# Altium schematic symbol library Regulator_Switching.SchLib: 1070 symbols (part 4 of 9) (continued)
## LTC1436A
designator *  value LTC1436A
ki_keywords: buck controller 36V; ki_description: High Efficiency Low Noise Synchronous Step-Down Switching Regulators, SSOP-24; ki_fp_filters: SSOP*3.9x8.7mm*P0.635mm*; Footprint: Package_SO:SSOP-24_3.9x8.7mm_P0.635mm; Supplier: https://www.analog.com/media/en/technical-documentation/data-sheets/14367afb.pdf
footprint SSOP-24_3.9x8.7mm_P0.635mm
pins: 1 COSC, 2 RUN/SS, 3 LBO (oc), 4 LBI (in), 5 ITH, 6 SFB, 7 SGND (power), 8 VPROG (in), 9 VOSENSE (in), 10 SENSE- (in), 11 SENSE+ (in), 12 AUXON (in), 13 AUXFB (in), 14 AUXDR (oc), 15 EXTVCC (power), 16 PGND (power), 17 BG (out), 18 INTVCC (power), 19 VIN (power), 20 TGS (out), 21 SW, 22 TGL (out), 23 BOOST, 24 POR (oc)

## LTC1436A-PLL
designator *  value LTC1436A-PLL
ki_keywords: buck controller 36V; ki_description: High Efficiency Low Noise Synchronous Step-Down Switching Regulators, SSOP-24; ki_fp_filters: SSOP*3.9x8.7mm*P0.635mm*; Footprint: Package_SO:SSOP-24_3.9x8.7mm_P0.635mm; Supplier: https://www.analog.com/media/en/technical-documentation/data-sheets/14367afb.pdf
footprint SSOP-24_3.9x8.7mm_P0.635mm
pins: 1 PLLLPF, 2 COSC, 3 RUN/SS, 4 ITH, 5 SFB, 6 SGND (power), 7 VPROG (in), 8 VOSENSE (in), 9 SENSE- (in), 10 SENSE+ (in), 11 AUXON (in), 12 AUXFB (in), 13 AUXDR (oc), 14 EXTVCC (power), 15 PGND (power), 16 BG (out), 17 INTVCC (power), 18 VIN (power), 19 TGS (out), 20 SW, 21 TGL (out), 22 BOOST, 23 POR (oc), 24 PLLIN (in)

## LTC1437A
designator *  value LTC1437A
ki_keywords: buck controller 36V; ki_description: High Efficiency Low Noise Synchronous Step-Down Switching Regulators, SSOP-28; ki_fp_filters: SSOP*5.3x10.2mm*P0.65mm*; Footprint: Package_SO:SSOP-28_5.3x10.2mm_P0.65mm; Supplier: https://www.analog.com/media/en/technical-documentation/data-sheets/14367afb.pdf
footprint SSOP-28_5.3x10.2mm_P0.65mm
pins: 1 PLLLPF, 2 COSC, 3 RUN/SS, 4 LBO (oc), 5 LBI (in), 6 ITH, 7 SFB, 8 SGND (power), 9 VPROG (in), 10 VOSENSE (in), 11 NC (in) hidden, 12 SENSE- (in), 13 SENSE+ (in), 14 AUXON (in), 15 AUXFB (in), 16 AUXDR (oc), 17 EXTVCC (power), 18 PGND (power), 19 BG (out), 20 DRVCC (power), 21 INTVCC (power), 22 VIN (power), 23 TGS (out), 24 SW, 25 TGL (out), 26 BOOST, 27 POR (oc), 28 PLLIN (in)

## LTC1878EMS8
designator *  value LTC1878EMS8
ki_keywords: Synchronous Step-Down Regulator; ki_description: High Efficiency Monolithic Synchronous Step-Down Regulator, MSOP-8; ki_fp_filters: MSOP*3x3mm*P0.65mm*; Footprint: Package_SO:MSOP-8_3x3mm_P0.65mm; Supplier: https://www.analog.com/media/en/technical-documentation/data-sheets/1878f.pdf
footprint MSOP-8_3x3mm_P0.65mm
pins: 1 RUN (in), 2 ITH (in), 3 VFB (in), 4 GND (power), 5 SW (out), 6 VIN (power), 7 SYNC/MODE (in), 8 PLL_LPF (io)

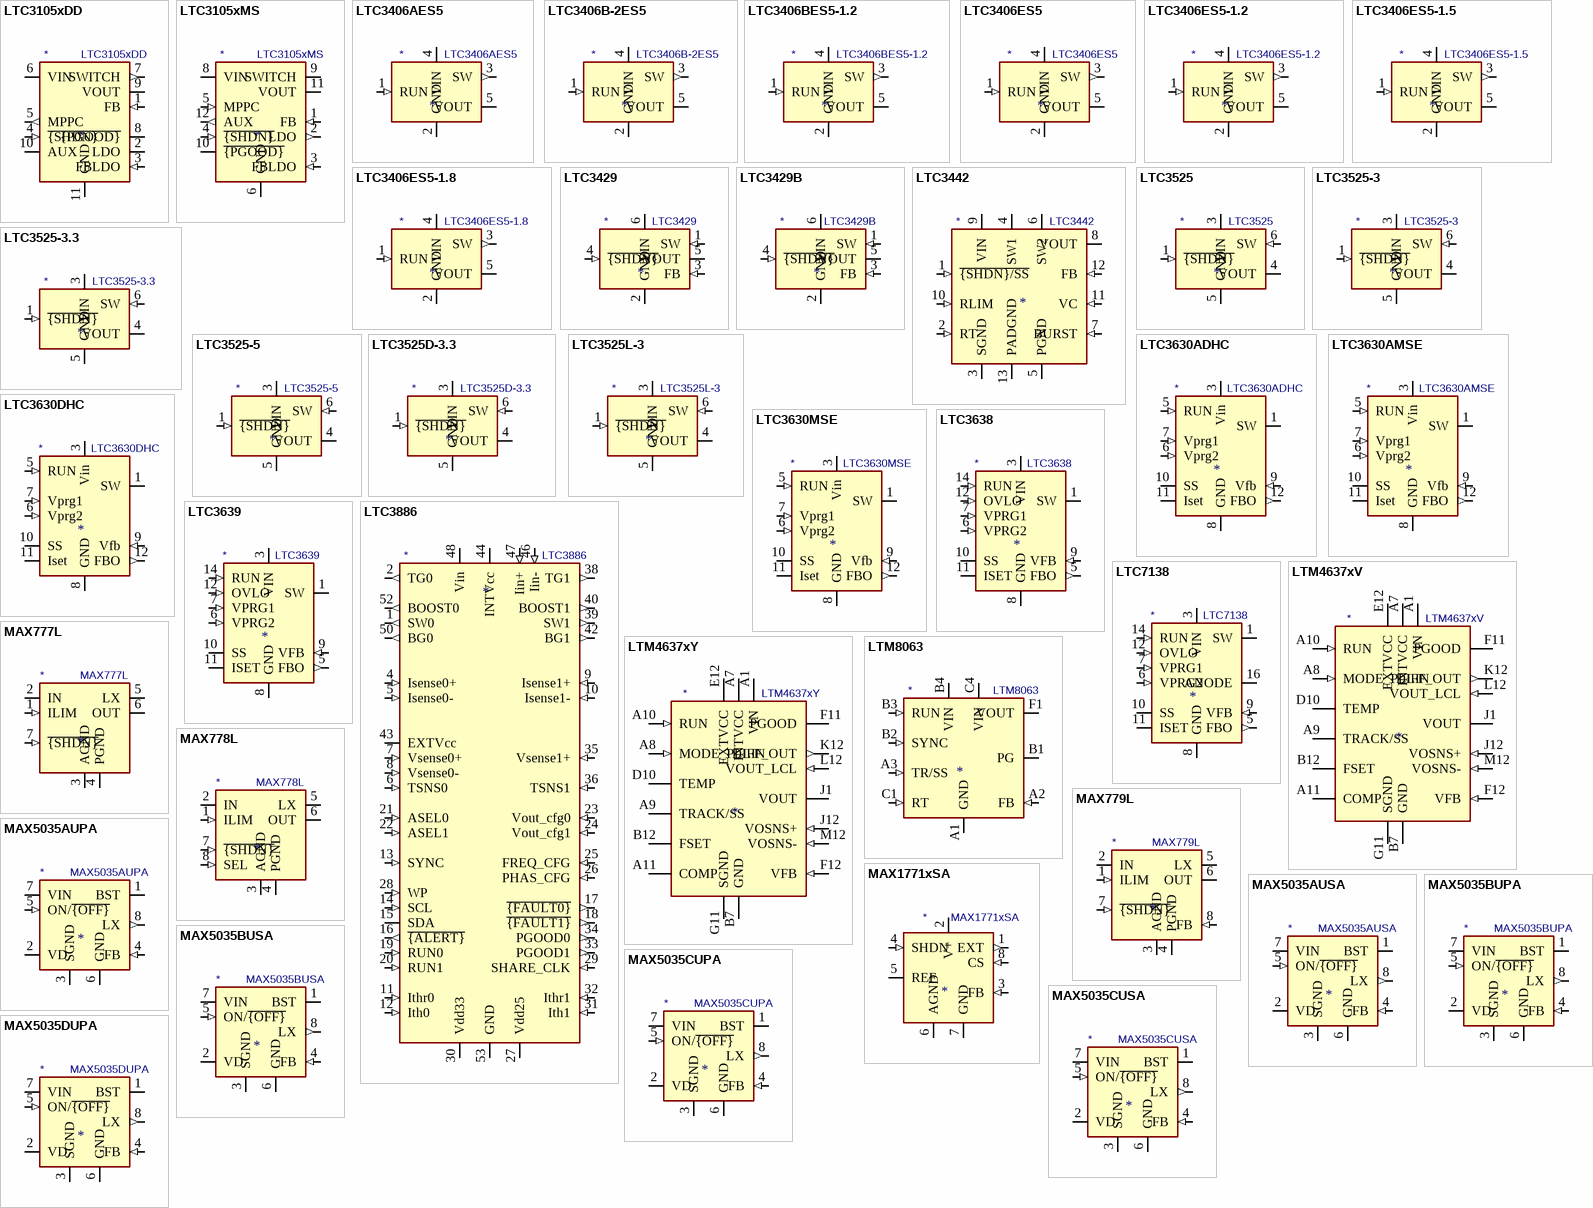
[diagram p12: symbols LTC3105xDD to MAX5035DUPA]

## LTC3105xDD
designator *  value LTC3105xDD
ki_keywords: Solar MPPT Maximum Power Point Control Converter Step-Up; ki_description: 400mA Step-Up DC/DC Converter with Maximum Power Point Control and 250mV Start-Up, DFN-10; ki_fp_filters: DFN*EP*3x3mm*0.5mm*EP*; Footprint: Package_DFN_QFN:DFN-10-1EP_3x3mm_P0.5mm_EP1.65x2.38mm; Supplier: https://www.analog.com/media/en/technical-documentation/data-sheets/3105fb.pdf
footprint DFN-10-1EP_3x3mm_P0.5mm_EP1.65x2.38mm
pins: 1 FB (in), 2 LDO (power), 3 FBLDO (in), 4 ~{{SHDN}} (in), 5 MPPC (out), 6 VIN (power), 7 SWITCH (out), 8 ~{{PGOOD}} (oc), 9 VOUT (power), 10 AUX (power), 11 GND (power)

## LTC3105xMS
designator *  value LTC3105xMS
ki_keywords: Solar MPPT Maximum Power Point Control Converter Step-Up; ki_description: 400mA Step-Up DC/DC Converter with Maximum Power Point Control and 250mV Start-Up, MSOP-12; ki_fp_filters: MSOP*3x4mm*0.65mm*; Footprint: Package_SO:MSOP-12_3x4mm_P0.65mm; Supplier: https://www.analog.com/media/en/technical-documentation/data-sheets/3105fb.pdf
footprint MSOP-12_3x4mm_P0.65mm
pins: 1 FB (in), 2 LDO (out), 3 FBLDO (in), 4 ~{{SHDN}} (in), 5 MPPC (in), 6 GND (power), 7 GND hidden, 8 VIN (power), 9 SWITCH, 10 ~{{PGOOD}} (oc), 11 VOUT (power), 12 AUX (out)

## LTC3406AES5
designator *  value LTC3406AES5
ki_keywords: Regulator step-down; ki_description: 600mA Synchronous Step-Down Regulator, 1.5MHz, Fixed 1.2V Output Voltage, Low Ripple Burst Mode, ThinSOT-23; ki_fp_filters: TSOT?23*; Footprint: Package_TO_SOT_SMD:TSOT-23-5; Supplier: https://www.analog.com/media/en/technical-documentation/data-sheets/3406afa.pdf
footprint TSOT-23-5
pins: 1 RUN (in), 2 GND (power), 3 SW (out), 4 VIN (power), 5 VOUT (power)

## LTC3406B-2ES5
designator *  value LTC3406B-2ES5
ki_keywords: Regulator step-down; ki_description: 600mA Synchronous Step-Down Regulator, 2.25MHz, Adjustable Output Voltage,ThinSOT-23; ki_fp_filters: TSOT?23*; Footprint: Package_TO_SOT_SMD:TSOT-23-5; Supplier: https://www.analog.com/media/en/technical-documentation/data-sheets/3406b2fs.pdf
footprint TSOT-23-5
pins: 1 RUN (in), 2 GND (power), 3 SW (out), 4 VIN (power), 5 VOUT (power)

## LTC3406BES5-1.2
designator *  value LTC3406BES5-1.2
ki_keywords: Regulator step-down; ki_description: 600mA Synchronous Step-Down Regulator, 1.5MHz, Fixed 1.2V Output Voltage, Burst Mode Disabled, ThinSOT-23; ki_fp_filters: TSOT?23*; Footprint: Package_TO_SOT_SMD:TSOT-23-5; Supplier: https://www.analog.com/media/en/technical-documentation/data-sheets/3406b12fs.pdf
footprint TSOT-23-5
pins: 1 RUN (in), 2 GND (power), 3 SW (out), 4 VIN (power), 5 VOUT (power)

## LTC3406ES5
designator *  value LTC3406ES5
ki_keywords: Regulator step-down; ki_description: 600mA Synchronous Step-Down Regulator, 1.5MHz, Adjustable Output Voltage, Burst Mode, ThinSOT-23; ki_fp_filters: TSOT?23*; Footprint: Package_TO_SOT_SMD:TSOT-23-5; Supplier: https://www.analog.com/media/en/technical-documentation/data-sheets/3406b12fs.pdf
footprint TSOT-23-5
pins: 1 RUN (in), 2 GND (power), 3 SW (out), 4 VIN (power), 5 VOUT (power)

## LTC3406ES5-1.2
designator *  value LTC3406ES5-1.2
ki_keywords: Regulator step-down; ki_description: 600mA Synchronous Step-Down Regulator, 1.5MHz, Fixed 1.2V Output Voltage, Burst Mode, ThinSOT-23; ki_fp_filters: TSOT?23*; Footprint: Package_TO_SOT_SMD:TSOT-23-5; Supplier: https://www.analog.com/media/en/technical-documentation/data-sheets/3406b12fs.pdf
footprint TSOT-23-5
pins: 1 RUN (in), 2 GND (power), 3 SW (out), 4 VIN (power), 5 VOUT (power)

## LTC3406ES5-1.5
designator *  value LTC3406ES5-1.5
ki_keywords: Regulator step-down; ki_description: 600mA Synchronous Step-Down Regulator, 1.5MHz, Fixed 1.5V Output Voltage, Burst Mode, ThinSOT-23; ki_fp_filters: TSOT?23*; Footprint: Package_TO_SOT_SMD:TSOT-23-5; Supplier: https://www.analog.com/media/en/technical-documentation/data-sheets/3406b12fs.pdf
footprint TSOT-23-5
pins: 1 RUN (in), 2 GND (power), 3 SW (out), 4 VIN (power), 5 VOUT (power)

## LTC3406ES5-1.8
designator *  value LTC3406ES5-1.8
ki_keywords: Regulator step-down; ki_description: 600mA Synchronous Step-Down Regulator, 1.5MHz, Fixed 1.8V Output Voltage, Burst Mode, ThinSOT-23; ki_fp_filters: TSOT?23*; Footprint: Package_TO_SOT_SMD:TSOT-23-5; Supplier: https://www.analog.com/media/en/technical-documentation/data-sheets/3406b12fs.pdf
footprint TSOT-23-5
pins: 1 RUN (in), 2 GND (power), 3 SW (out), 4 VIN (power), 5 VOUT (power)

## LTC3429
designator *  value LTC3429
ki_keywords: boost step-up DC/DC synchronous; ki_description: 600mA, 500kHz Micropower Synchronous Boost Converter with Output Disconnect, TSOT-23-6; ki_fp_filters: TSOT?23*; Footprint: Package_TO_SOT_SMD:TSOT-23-6; Supplier: https://www.analog.com/media/en/technical-documentation/data-sheets/3429fa.pdf
footprint TSOT-23-6
pins: 1 SW (in), 2 GND (power), 3 FB (in), 4 ~{{SHDN}} (in), 5 VOUT (power), 6 VIN (power)

## LTC3429B
designator *  value LTC3429B
ki_keywords: boost step-up DC/DC synchronous; ki_description: 600mA, 500kHz Micropower Synchronous Boost Converter with Output Disconnect, Continuous Switching at Light Loads, TSOT-23-6; ki_fp_filters: TSOT?23*; Footprint: Package_TO_SOT_SMD:TSOT-23-6; Supplier: https://www.analog.com/media/en/technical-documentation/data-sheets/3429fa.pdf
footprint TSOT-23-6
pins: 1 SW (in), 2 GND (power), 3 FB (in), 4 ~{{SHDN}} (in), 5 VOUT (power), 6 VIN (power)

## LTC3442
designator *  value LTC3442
ki_keywords: Micropower Synchronous Buck-Boost DC/DC Converter; ki_description: Micropower Synchronous Buck-Boost DC/DC Converter with Automatic Burst Mode Operation, DFN-12; ki_fp_filters: DFN*EP*3x4mm*P0.5mm*; Footprint: Package_DFN_QFN:DFN-12-1EP_3x4mm_P0.5mm_EP1.7x3.3mm; Supplier: https://www.analog.com/media/en/technical-documentation/data-sheets/3442fb.pdf
footprint DFN-12-1EP_3x4mm_P0.5mm_EP1.7x3.3mm
pins: 1 ~{{SHDN}/SS} (in), 2 RT (in), 3 SGND (power), 4 SW1 (io), 5 PGND (power), 6 SW2 (io), 7 BURST (in), 8 VOUT (power), 9 VIN (power), 10 RLIM (in), 11 VC (in), 12 FB (in), 13 PADGND (power)

## LTC3525
designator *  value LTC3525
ki_keywords: boost step-up DC/DC synchronous; ki_description: 400mA Micropower Synchronous Step-Up DC/DC Converter with Output Disconnect, SC-70-6; ki_fp_filters: *SC?70* SOT?363*; Footprint: Package_TO_SOT_SMD:SOT-363_SC-70-6; Supplier: https://www.analog.com/media/en/technical-documentation/data-sheets/3525fc.pdf
footprint SOT-363_SC-70-6
pins: 1 ~{{SHDN}} (in), 2 GND hidden, 3 VIN (power), 4 VOUT (power), 5 GND (power), 6 SW (in)

## LTC3525-3
designator *  value LTC3525-3
ki_keywords: fixed boost step-up DC/DC synchronous; ki_description: Fixed 3V, 400mA Micropower Synchronous Step-Up DC/DC Converter with Output Disconnect, SC-70-6; ki_fp_filters: *SC?70* SOT?363*; Footprint: Package_TO_SOT_SMD:SOT-363_SC-70-6; Supplier: https://www.analog.com/media/en/technical-documentation/data-sheets/3525fc.pdf
footprint SOT-363_SC-70-6
pins: 1 ~{{SHDN}} (in), 2 GND hidden, 3 VIN (power), 4 VOUT (power), 5 GND (power), 6 SW (in)

## LTC3525-3.3
designator *  value LTC3525-3.3
ki_keywords: fixed boost step-up DC/DC synchronous; ki_description: Fixed 3V3, 400mA Micropower Synchronous Step-Up DC/DC Converter with Output Disconnect, SC-70-6; ki_fp_filters: *SC?70* SOT?363*; Footprint: Package_TO_SOT_SMD:SOT-363_SC-70-6; Supplier: https://www.analog.com/media/en/technical-documentation/data-sheets/3525fc.pdf
footprint SOT-363_SC-70-6
pins: 1 ~{{SHDN}} (in), 2 GND hidden, 3 VIN (power), 4 VOUT (power), 5 GND (power), 6 SW (in)

## LTC3525-5
designator *  value LTC3525-5
ki_keywords: fixed boost step-up DC/DC synchronous; ki_description: Fixed 5V, 400mA Micropower Synchronous Step-Up DC/DC Converter with Output Disconnect, SC-70-6; ki_fp_filters: *SC?70* SOT?363*; Footprint: Package_TO_SOT_SMD:SOT-363_SC-70-6; Supplier: https://www.analog.com/media/en/technical-documentation/data-sheets/3525fc.pdf
footprint SOT-363_SC-70-6
pins: 1 ~{{SHDN}} (in), 2 GND hidden, 3 VIN (power), 4 VOUT (power), 5 GND (power), 6 SW (in)

## LTC3525D-3.3
designator *  value LTC3525D-3.3
ki_keywords: fixed boost step-up DC/DC synchronous; ki_description: Fixed 3V3, 400mA Micropower Synchronous Step-Up DC/DC Converter with Pass Through Mode, SC-70-6; ki_fp_filters: *SC?70* SOT?363*; Footprint: Package_TO_SOT_SMD:SOT-363_SC-70-6; Supplier: https://www.analog.com/media/en/technical-documentation/data-sheets/3525d33fb.pdf
footprint SOT-363_SC-70-6
pins: 1 ~{{SHDN}} (in), 2 GND hidden, 3 VIN (power), 4 VOUT (power), 5 GND (power), 6 SW (in)

## LTC3525L-3
designator *  value LTC3525L-3
ki_keywords: fixed boost step-up DC/DC synchronous; ki_description: Fixed 3V, 400mA Micropower Synchronous Step-Up DC/DC Converter with Output Disconnect, SC-70-6; ki_fp_filters: *SC?70* SOT?363*; Footprint: Package_TO_SOT_SMD:SOT-363_SC-70-6; Supplier: https://www.analog.com/media/en/technical-documentation/data-sheets/3525laf.pdf
footprint SOT-363_SC-70-6
pins: 1 ~{{SHDN}} (in), 2 GND hidden, 3 VIN (power), 4 VOUT (power), 5 GND (power), 6 SW (in)

## LTC3630ADHC
designator *  value LTC3630ADHC
ki_keywords: buck dc-dc switcher switching; ki_description: High efficiency 76V 500mA synchronous step-down converter, DFN-16; ki_fp_filters: DFN*EP*3x5mm*P0.5mm*; Footprint: Package_DFN_QFN:DFN-16-1EP_3x5mm_P0.5mm_EP1.66x4.4mm; Supplier: https://www.analog.com/media/en/technical-documentation/data-sheets/3630afc.pdf
footprint DFN-16-1EP_3x5mm_P0.5mm_EP1.66x4.4mm
pins: 1 SW, 2 NC (in) hidden, 3 Vin (power), 4 NC (in) hidden, 5 RUN (in), 6 Vprg2 (in), 7 Vprg1 (in), 8 GND (power), 9 Vfb (in), 10 SS, 11 Iset, 12 FBO (out), 13 NC (in) hidden, 14 GND hidden, 15 NC (in) hidden, 16 GND hidden, 17 GND hidden

## LTC3630AMSE
designator *  value LTC3630AMSE
ki_keywords: buck dc-dc switcher switching; ki_description: High efficiency 76V 500mA synchronous step-down converter, MSOP-16(12); ki_fp_filters: Linear*MSOP*12*16*EP*3x4mm*P0.5mm*; Footprint: Package_SO:Linear_MSOP-12-16-1EP_3x4mm_P0.5mm; Supplier: https://www.analog.com/media/en/technical-documentation/data-sheets/3630afc.pdf
footprint Linear_MSOP-12-16-1EP_3x4mm_P0.5mm
pins: 1 SW, 3 Vin (power), 5 RUN (in), 6 Vprg2 (in), 7 Vprg1 (in), 8 GND (power), 9 Vfb (in), 10 SS, 11 Iset, 12 FBO (out), 14 GND hidden, 16 GND hidden, 17 GND hidden

## LTC3630DHC
designator *  value LTC3630DHC
ki_keywords: buck dc-dc switcher switching; ki_description: 500mA High efficiency 65V synchronous step-down converter, DFN-16; ki_fp_filters: DFN*EP*3x5mm*P0.5mm*; Footprint: Package_DFN_QFN:DFN-16-1EP_3x5mm_P0.5mm_EP1.66x4.4mm; Supplier: https://www.analog.com/media/en/technical-documentation/data-sheets/3630fd.pdf
footprint DFN-16-1EP_3x5mm_P0.5mm_EP1.66x4.4mm
pins: 1 SW, 2 NC (in) hidden, 3 Vin (power), 4 NC (in) hidden, 5 RUN (in), 6 Vprg2 (in), 7 Vprg1 (in), 8 GND (power), 9 Vfb (in), 10 SS, 11 Iset, 12 FBO (out), 13 NC (in) hidden, 14 GND hidden, 15 NC (in) hidden, 16 GND hidden, 17 GND hidden

## LTC3630MSE
designator *  value LTC3630MSE
ki_keywords: buck dc-dc switcher switching; ki_description: 500mA High efficiency 65V synchronous step-down converter, MSOP-16(12); ki_fp_filters: Linear*MSOP*12*16*EP*3x4mm*P0.5mm*; Footprint: Package_SO:Linear_MSOP-12-16-1EP_3x4mm_P0.5mm; Supplier: https://www.analog.com/media/en/technical-documentation/data-sheets/3630fd.pdf
footprint Linear_MSOP-12-16-1EP_3x4mm_P0.5mm
pins: 1 SW, 3 Vin (power), 5 RUN (in), 6 Vprg2 (in), 7 Vprg1 (in), 8 GND (power), 9 Vfb (in), 10 SS, 11 Iset, 12 FBO (out), 14 GND hidden, 16 GND hidden, 17 GND hidden

## LTC3638
designator *  value LTC3638
ki_keywords: buck dc-dc switcher switching; ki_description: 250mA High efficiency 140V step-down converter, MSOP-16(12); ki_fp_filters: Linear*MSOP*12*16*EP*3x4mm*P0.5mm*; Footprint: Package_SO:Linear_MSOP-12-16-1EP_3x4mm_P0.5mm; Supplier: https://www.analog.com/media/en/technical-documentation/data-sheets/3638fa.pdf
footprint Linear_MSOP-12-16-1EP_3x4mm_P0.5mm
pins: 1 SW, 3 VIN (power), 5 FBO (out), 6 VPRG2 (in), 7 VPRG1 (in), 8 GND (power), 9 VFB (in), 10 SS, 11 ISET, 12 OVLO (in), 14 RUN (in), 16 GND hidden, 17 GND hidden

## LTC3639
designator *  value LTC3639
ki_keywords: buck dc-dc switcher switching; ki_description: 100mA High efficiency 150V syncrhonous step-down converter, MSOP-16(12); ki_fp_filters: Linear*MSOP*12*16*EP*3x4mm*P0.5mm*; Footprint: Package_SO:Linear_MSOP-12-16-1EP_3x4mm_P0.5mm; Supplier: https://www.analog.com/media/en/technical-documentation/data-sheets/3639fd.pdf
footprint Linear_MSOP-12-16-1EP_3x4mm_P0.5mm
pins: 1 SW, 3 VIN (power), 5 FBO (out), 6 VPRG2 (in), 7 VPRG1 (in), 8 GND (power), 9 VFB (in), 10 SS, 11 ISET, 12 OVLO (in), 14 RUN (in), 16 GND hidden, 17 GND hidden

## LTC3886
designator *  value LTC3886
ki_keywords: step down switch manager I2C telemetry fault current sense; ki_description: 60V dual output buck output with digital power system management, UKG52(46); ki_fp_filters: Linear*UGK52*QFN*46*52*; Footprint: Package_DFN_QFN:Linear_UGK52_QFN-46-52; Supplier: https://www.analog.com/media/en/technical-documentation/data-sheets/LTC3886-3886-1.pdf
footprint Linear_UGK52_QFN-46-52
pins: 1 SW0 (out), 2 TG0 (out), 4 Isense0+ (in), 5 Isense0- (in), 6 TSNS0 (in), 7 Vsense0+ (in), 8 Vsense0- (in), 9 Isense1+ (in), 10 Isense1- (in), 11 Ithr0 (in), 12 Ith0 (in), 13 SYNC (in), 14 SCL (in), 15 SDA (io), 16 ~{{ALERT}} (out), 17 ~{{FAULT0}} (out), 18 ~{{FAULT1}} (out), 19 RUN0 (in), 20 RUN1 (in), 21 ASEL0 (in), 22 ASEL1 (in), 23 Vout_cfg0 (in), 24 Vout_cfg1 (in), 25 FREQ_CFG (in), 26 PHAS_CFG (in), 27 Vdd25 (power), 28 WP (in), 29 SHARE_CLK (in), 30 Vdd33 (power), 31 Ith1 (in), 32 Ithr1 (in), 33 PGOOD1 (out), 34 PGOOD0 (out), 35 Vsense1+ (in), 36 TSNS1 (in), 38 TG1 (out), 39 SW1 (out), 40 BOOST1 (out), 42 BG1 (out), 43 EXTVcc (power), 44 INTVcc (power), 46 Iin- (in), 47 Iin+ (in), 48 Vin (power), 50 BG0 (out), 52 BOOST0 (out), 53 GND (power)

## LTC7138
designator *  value LTC7138
ki_keywords: buck dc-dc switcher switching; ki_description: 400mA High efficiency 140V step-down converter, MSOP-16(12); ki_fp_filters: Linear*MSOP*12*16*EP*3x4mm*P0.5mm*; Footprint: Package_SO:Linear_MSOP-12-16-1EP_3x4mm_P0.5mm; Supplier: https://www.analog.com/media/en/technical-documentation/data-sheets/7138f.pdf
footprint Linear_MSOP-12-16-1EP_3x4mm_P0.5mm
pins: 1 SW, 3 VIN (power), 5 FBO (out), 6 VPRG2 (in), 7 VPRG1 (in), 8 GND (power), 9 VFB (in), 10 SS, 11 ISET, 12 OVLO (in), 14 RUN (in), 16 ANODE, 17 GND hidden

## LTM4637xV
designator *  value LTM4637xV
ki_keywords: uModule DCDC; ki_description: 20A DC/DC µModule Step-Down Regulator, LGA-133; ki_fp_filters: Linear*LGA*15.0x15.0mm*Layout12x12*P1.27mm*; Footprint: Package_LGA:Linear_LGA-133_15.0x15.0mm_Layout12x12_P1.27mm; Supplier: https://www.analog.com/media/en/technical-documentation/data-sheets/4637fc.pdf
footprint Linear_LGA-133_15.0x15.0mm_Layout12x12_P1.27mm
pins: A1 VIN (power), A2 VIN hidden, A3 VIN hidden, A4 VIN hidden, A5 VIN hidden, A6 VIN hidden, A7 INTVCC (power), A8 MODE_PLLIN (in), A9 TRACK/SS, A10 RUN (in), A11 COMP, A12 MTP1 (in) hidden, B1 VIN hidden, B2 VIN hidden, B3 VIN hidden, B4 VIN hidden, B5 VIN hidden, B6 VIN hidden, B7 GND (power), B9 GND hidden, B11 MTP2 (in) hidden, B12 FSET, C1 VIN hidden, C2 VIN hidden, C3 VIN hidden, C4 VIN hidden, C5 VIN hidden, C6 VIN hidden, C7 GND hidden, C9 GND hidden, C10 MTP3 (in) hidden, C11 MTP4 (in) hidden, C12 MTP5 (in) hidden, D1 GND hidden, D2 GND hidden, D3 GND hidden, D4 GND hidden, D5 GND hidden, D6 GND hidden, D8 GND hidden, D9 INTVCC hidden, D10 TEMP, D11 MTP6 (in) hidden, D12 MTP7 (in) hidden, E1 GND hidden, E2 GND hidden, E3 GND hidden, E4 GND hidden, E5 GND hidden, E6 GND hidden, E7 GND hidden, E9 GND hidden, E12 EXTVCC (power), F1 GND hidden, F2 GND hidden, F3 GND hidden, F4 GND hidden, F5 GND hidden, F6 GND hidden, F7 GND hidden, F8 GND hidden, F9 GND hidden, F11 PGOOD (oc), F12 VFB (in), G1 GND hidden, G2 GND hidden, G3 GND hidden, G4 GND hidden, G5 GND hidden, G6 GND hidden, G7 GND hidden, G8 GND hidden, G9 GND hidden, G11 SGND (power), G12 PGOOD (oc) hidden, H1 GND hidden, H2 GND hidden, H3 GND hidden, H4 GND hidden, H5 GND hidden, H6 GND hidden, H7 GND hidden, H8 GND hidden, H9 GND hidden, H11 SGND hidden, H12 SGND hidden, J1 VOUT (power), J2 VOUT hidden, J3 VOUT hidden, J4 VOUT hidden, J5 VOUT hidden, J6 VOUT hidden, J7 VOUT hidden, J8 VOUT hidden, J9 VOUT hidden, J10 VOUT hidden, J12 VOSNS+ (in), K1 VOUT hidden, K2 VOUT hidden, K3 VOUT hidden, K4 VOUT hidden, K5 VOUT hidden, K6 VOUT hidden, K7 VOUT hidden, K8 VOUT hidden, K9 VOUT hidden, K10 VOUT hidden, K11 VOUT hidden, K12 DIFF_OUT (out), L1 VOUT hidden, L2 VOUT hidden, L3 VOUT hidden, L4 VOUT hidden, L5 VOUT hidden, L6 VOUT hidden, L7 VOUT hidden, L8 VOUT hidden, L9 VOUT hidden, L10 VOUT hidden, L11 VOUT hidden, L12 VOUT_LCL (in), M1 VOUT hidden, M2 VOUT hidden, M3 VOUT hidden, M4 VOUT hidden, M5 VOUT hidden, M6 VOUT hidden, M7 VOUT hidden, M8 VOUT hidden, M9 VOUT hidden, M10 VOUT hidden, M11 VOUT hidden, M12 VOSNS- (in)

## LTM4637xY
designator *  value LTM4637xY
ki_keywords: uModule DCDC; ki_description: 20A DC/DC µModule Step-Down Regulator, BGA-133; ki_fp_filters: Linear*BGA*15.0x15.0mm*Layout12x12*P1.27mm*; Footprint: Package_BGA:Linear_BGA-133_15.0x15.0mm_Layout12x12_P1.27mm; Supplier: https://www.analog.com/media/en/technical-documentation/data-sheets/4637fc.pdf
footprint Linear_BGA-133_15.0x15.0mm_Layout12x12_P1.27mm
pins: A1 VIN (power), A2 VIN hidden, A3 VIN hidden, A4 VIN hidden, A5 VIN hidden, A6 VIN hidden, A7 INTVCC (power), A8 MODE_PLLIN (in), A9 TRACK/SS, A10 RUN (in), A11 COMP, A12 MTP1 (in) hidden, B1 VIN hidden, B2 VIN hidden, B3 VIN hidden, B4 VIN hidden, B5 VIN hidden, B6 VIN hidden, B7 GND (power), B9 GND hidden, B11 MTP2 (in) hidden, B12 FSET, C1 VIN hidden, C2 VIN hidden, C3 VIN hidden, C4 VIN hidden, C5 VIN hidden, C6 VIN hidden, C7 GND hidden, C9 GND hidden, C10 MTP3 (in) hidden, C11 MTP4 (in) hidden, C12 MTP5 (in) hidden, D1 GND hidden, D2 GND hidden, D3 GND hidden, D4 GND hidden, D5 GND hidden, D6 GND hidden, D8 GND hidden, D9 INTVCC hidden, D10 TEMP, D11 MTP6 (in) hidden, D12 MTP7 (in) hidden, E1 GND hidden, E2 GND hidden, E3 GND hidden, E4 GND hidden, E5 GND hidden, E6 GND hidden, E7 GND hidden, E9 GND hidden, E12 EXTVCC (power), F1 GND hidden, F2 GND hidden, F3 GND hidden, F4 GND hidden, F5 GND hidden, F6 GND hidden, F7 GND hidden, F8 GND hidden, F9 GND hidden, F11 PGOOD (oc), F12 VFB (in), G1 GND hidden, G2 GND hidden, G3 GND hidden, G4 GND hidden, G5 GND hidden, G6 GND hidden, G7 GND hidden, G8 GND hidden, G9 GND hidden, G11 SGND (power), G12 PGOOD (oc) hidden, H1 GND hidden, H2 GND hidden, H3 GND hidden, H4 GND hidden, H5 GND hidden, H6 GND hidden, H7 GND hidden, H8 GND hidden, H9 GND hidden, H11 SGND hidden, H12 SGND hidden, J1 VOUT (power), J2 VOUT hidden, J3 VOUT hidden, J4 VOUT hidden, J5 VOUT hidden, J6 VOUT hidden, J7 VOUT hidden, J8 VOUT hidden, J9 VOUT hidden, J10 VOUT hidden, J12 VOSNS+ (in), K1 VOUT hidden, K2 VOUT hidden, K3 VOUT hidden, K4 VOUT hidden, K5 VOUT hidden, K6 VOUT hidden, K7 VOUT hidden, K8 VOUT hidden, K9 VOUT hidden, K10 VOUT hidden, K11 VOUT hidden, K12 DIFF_OUT (out), L1 VOUT hidden, L2 VOUT hidden, L3 VOUT hidden, L4 VOUT hidden, L5 VOUT hidden, L6 VOUT hidden, L7 VOUT hidden, L8 VOUT hidden, L9 VOUT hidden, L10 VOUT hidden, L11 VOUT hidden, L12 VOUT_LCL (in), M1 VOUT hidden, M2 VOUT hidden, M3 VOUT hidden, M4 VOUT hidden, M5 VOUT hidden, M6 VOUT hidden, M7 VOUT hidden, M8 VOUT hidden, M9 VOUT hidden, M10 VOUT hidden, M11 VOUT hidden, M12 VOSNS- (in)

## LTM8063
designator *  value LTM8063
ki_keywords: uModule DCDC; ki_description: 40VIN, 2A Silent Switcher µModule Regulator, BGA-28; ki_fp_filters: Analog*BGA*4.0x6.25mm*; Footprint: Package_BGA:Analog_BGA-28_4.0x6.25mm_Layout4x7_P0.8mm_Ball0.45mm_Pad0.4; Supplier: https://www.analog.com/media/en/technical-documentation/data-sheets/8063fa.pdf
footprint Analog_BGA-28_4.0x6.25mm_Layout4x7_P0.8mm_Ball0.45mm_Pad0.4
pins: A1 GND (power), A2 FB (in), A3 TR/SS (in), A4 GND hidden, B1 PG (oc), B2 SYNC (in), B3 RUN (in), B4 VIN (power), C1 RT (in), C2 GND hidden, C3 GND hidden, C4 VIN (power), D1 GND hidden, D2 GND hidden, D3 GND hidden, D4 GND hidden, E1 GND hidden, E2 GND hidden, E3 GND hidden, E4 GND hidden, F1 VOUT (power), F2 VOUT hidden, F3 VOUT hidden, F4 VOUT hidden, G1 VOUT hidden, G2 VOUT hidden, G3 VOUT hidden, G4 VOUT hidden

## MAX777L
designator *  value MAX777L
ki_keywords: switching regulator boost step-up dc-dc; ki_description: 210mA, Low voltage input, step-up DC-DC converter, 5V output voltage, DIP-8/SO-8; ki_fp_filters: SOIC*3.9x4.9mm*P1.27mm* DIP*W7.62mm*; Supplier: https://kanga.gerbilator.org/ICs/MAX777.pdf
pins: 1 ILIM (in), 2 IN (power), 3 AGND (power), 4 PGND (power), 5 LX, 6 OUT (power), 7 ~{{SHDN}} (in), 8 NC (in) hidden

## MAX778L
designator *  value MAX778L
ki_keywords: switching regulator boost step-up dc-dc; ki_description: 210mA, Low voltage input, step-up DC-DC converter, 3V/3.3V output voltage, DIP-8/SO-8; ki_fp_filters: SOIC*3.9x4.9mm*P1.27mm* DIP*W7.62mm*; Supplier: https://kanga.gerbilator.org/ICs/MAX777.pdf
pins: 1 ILIM (in), 2 IN (power), 3 AGND (power), 4 PGND (power), 5 LX, 6 OUT (power), 7 ~{{SHDN}} (in), 8 SEL (in)

## MAX779L
designator *  value MAX779L
ki_keywords: switching regulator boost step-up dc-dc; ki_description: 210mA, Low voltage input, step-up DC-DC converter, adjustable output voltage, DIP-8/SO-8; ki_fp_filters: SOIC*3.9x4.9mm*P1.27mm* DIP*W7.62mm*; Supplier: https://kanga.gerbilator.org/ICs/MAX777.pdf
pins: 1 ILIM (in), 2 IN (power), 3 AGND (power), 4 PGND (power), 5 LX, 6 OUT (power), 7 ~{{SHDN}} (in), 8 FB (in)

## MAX1771xSA
designator *  value MAX1771xSA
ki_keywords: Adjustable Step-Up Boost Controller; ki_description: 12V or Adjustable, High-Efficiency, Low IQ, Step-Up DC-DC Controller, SO-8; ki_fp_filters: SO*3.9x4.9mm*P1.27mm*; Footprint: Package_SO:SO-8_3.9x4.9mm_P1.27mm; Supplier: https://datasheets.maximintegrated.com/en/ds/MAX1771.pdf
footprint SO-8_3.9x4.9mm_P1.27mm
pins: 1 EXT (out), 2 V+ (power), 3 FB (in), 4 SHDN (in), 5 REF, 6 AGND (power), 7 GND (power), 8 CS (in)

## MAX5035AUPA
designator *  value MAX5035AUPA
ki_keywords: 3.3V 1A Step-Down Converter 76V; ki_description: 1A, High-Efficiency Step-Down DC-DC Converter, 3.3V fixed output voltage, Vin 76V, PDIP-8; ki_fp_filters: DIP*W7.62mm*; Footprint: Package_DIP:DIP-8_W7.62mm; Supplier: http://datasheets.maximintegrated.com/en/ds/MAX5035.pdf
footprint DIP-8_W7.62mm
pins: 1 BST, 2 VD, 3 SGND (power), 4 FB (in), 5 ON/~{{OFF}} (in), 6 GND (power), 7 VIN (power), 8 LX (out)

## MAX5035AUSA
designator *  value MAX5035AUSA
ki_keywords: 3.3V 1A Step-Down Converter 76V; ki_description: 1A, High-Efficiency Step-Down DC-DC Converter, 3.3V fixed output voltage, Vin 76V, SO-8; ki_fp_filters: SOIC*3.9x4.9mm*P1.27mm*; Footprint: Package_SO:SOIC-8_3.9x4.9mm_P1.27mm; Supplier: http://datasheets.maximintegrated.com/en/ds/MAX5035.pdf
footprint SOIC-8_3.9x4.9mm_P1.27mm
pins: 1 BST, 2 VD, 3 SGND (power), 4 FB (in), 5 ON/~{{OFF}} (in), 6 GND (power), 7 VIN (power), 8 LX (out)

## MAX5035BUPA
designator *  value MAX5035BUPA
ki_keywords: 5V 1A Step-Down Converter 76V; ki_description: 1A, High-Efficiency Step-Down DC-DC Converter, 5V fixed output voltage, Vin 76V, PDIP-8; ki_fp_filters: DIP*W7.62mm*; Footprint: Package_DIP:DIP-8_W7.62mm; Supplier: http://datasheets.maximintegrated.com/en/ds/MAX5035.pdf
footprint DIP-8_W7.62mm
pins: 1 BST, 2 VD, 3 SGND (power), 4 FB (in), 5 ON/~{{OFF}} (in), 6 GND (power), 7 VIN (power), 8 LX (out)

## MAX5035BUSA
designator *  value MAX5035BUSA
ki_keywords: 5V 1A Step-Down Converter 76V; ki_description: 1A, High-Efficiency Step-Down DC-DC Converter, 5V fixed output voltage, Vin 76V, SO-8; ki_fp_filters: SOIC*3.9x4.9mm*P1.27mm*; Footprint: Package_SO:SOIC-8_3.9x4.9mm_P1.27mm; Supplier: http://datasheets.maximintegrated.com/en/ds/MAX5035.pdf
footprint SOIC-8_3.9x4.9mm_P1.27mm
pins: 1 BST, 2 VD, 3 SGND (power), 4 FB (in), 5 ON/~{{OFF}} (in), 6 GND (power), 7 VIN (power), 8 LX (out)

## MAX5035CUPA
designator *  value MAX5035CUPA
ki_keywords: 12V 1A Step-Down Converter 76V; ki_description: 1A, High-Efficiency Step-Down DC-DC Converter, 12V fixed output voltage, Vin 76V, PDIP-8; ki_fp_filters: DIP*W7.62mm*; Footprint: Package_DIP:DIP-8_W7.62mm; Supplier: http://datasheets.maximintegrated.com/en/ds/MAX5035.pdf
footprint DIP-8_W7.62mm
pins: 1 BST, 2 VD, 3 SGND (power), 4 FB (in), 5 ON/~{{OFF}} (in), 6 GND (power), 7 VIN (power), 8 LX (out)

## MAX5035CUSA
designator *  value MAX5035CUSA
ki_keywords: 12V 1A Step-Down Converter 76V; ki_description: 1A, High-Efficiency Step-Down DC-DC Converter, 12V fixed output voltage, Vin 76V, SO-8; ki_fp_filters: SOIC*3.9x4.9mm*P1.27mm*; Footprint: Package_SO:SOIC-8_3.9x4.9mm_P1.27mm; Supplier: http://datasheets.maximintegrated.com/en/ds/MAX5035.pdf
footprint SOIC-8_3.9x4.9mm_P1.27mm
pins: 1 BST, 2 VD, 3 SGND (power), 4 FB (in), 5 ON/~{{OFF}} (in), 6 GND (power), 7 VIN (power), 8 LX (out)

## MAX5035DUPA
designator *  value MAX5035DUPA
ki_keywords: Adjustable 1A Step-Down Converter 76V; ki_description: 1A, High-Efficiency Step-Down DC-DC Converter, adjustable output voltage, Vin 76V, PDIP-8; ki_fp_filters: DIP*W7.62mm*; Footprint: Package_DIP:DIP-8_W7.62mm; Supplier: http://datasheets.maximintegrated.com/en/ds/MAX5035.pdf
footprint DIP-8_W7.62mm
pins: 1 BST, 2 VD, 3 SGND (power), 4 FB (in), 5 ON/~{{OFF}} (in), 6 GND (power), 7 VIN (power), 8 LX (out)

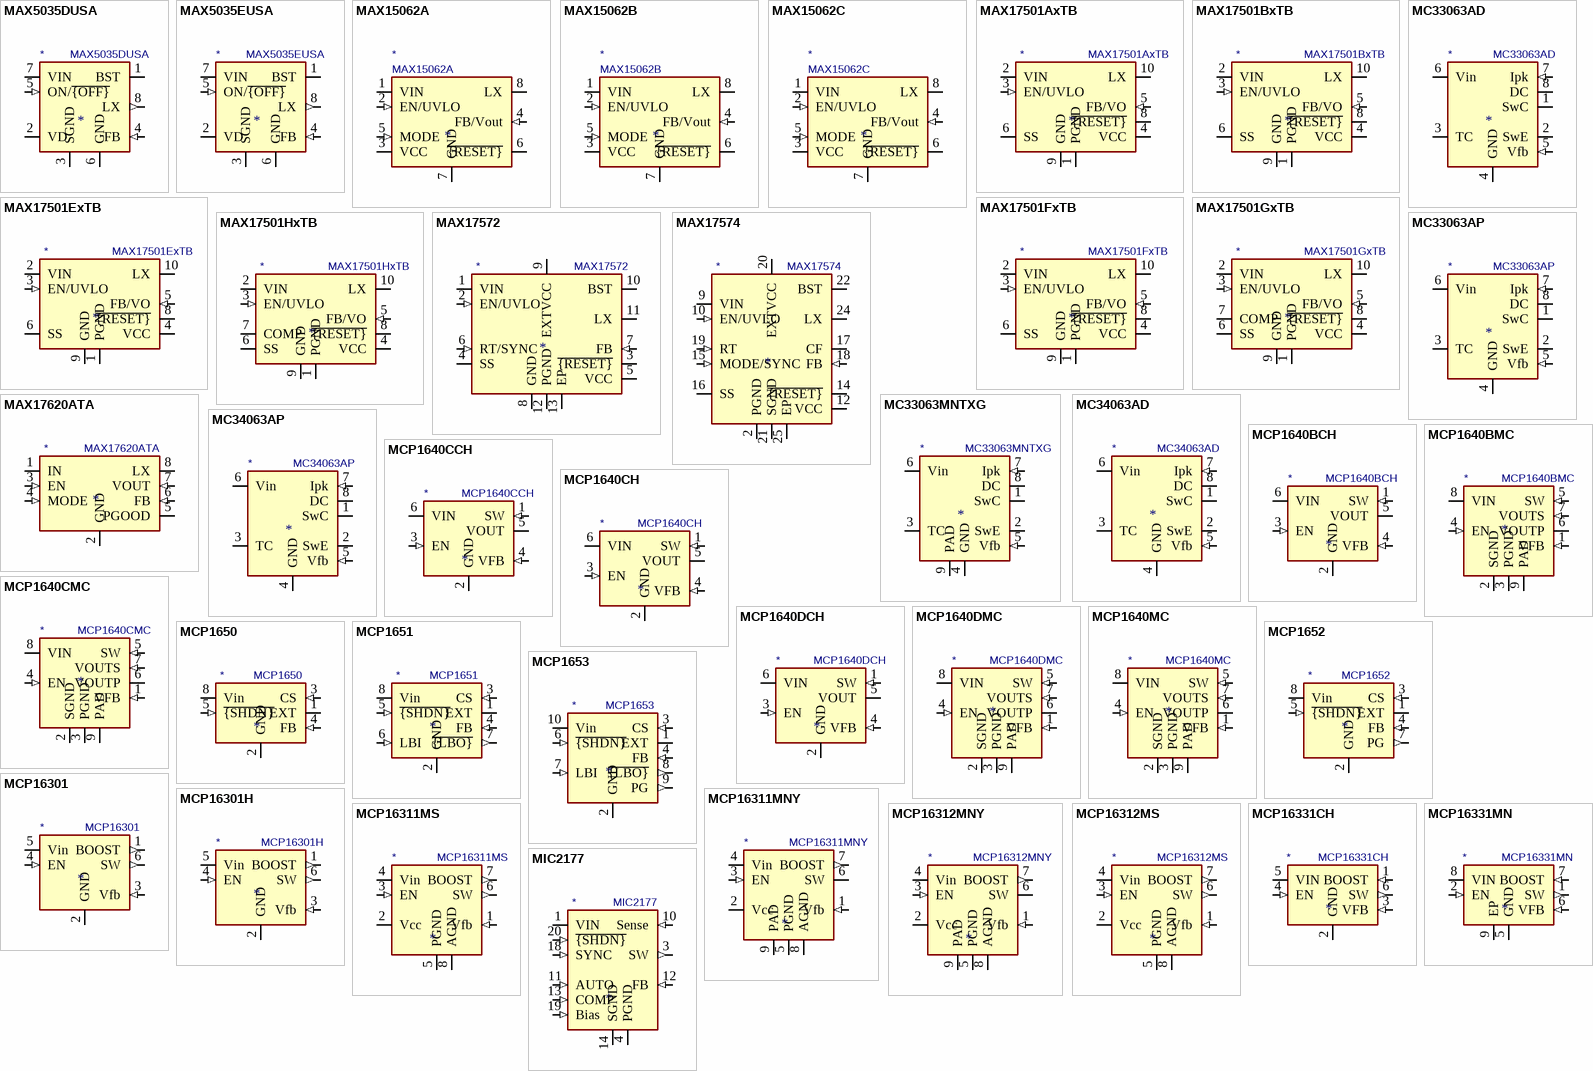
[diagram p13: symbols MAX5035DUSA to MIC2177]

## MAX5035DUSA
designator *  value MAX5035DUSA
ki_keywords: Adjustable 1A Step-Down Converter 76V; ki_description: 1A, High-Efficiency Step-Down DC-DC Converter, adjustable output voltage, Vin 76V, SO-8; ki_fp_filters: SOIC*3.9x4.9mm*P1.27mm*; Footprint: Package_SO:SOIC-8_3.9x4.9mm_P1.27mm; Supplier: http://datasheets.maximintegrated.com/en/ds/MAX5035.pdf
footprint SOIC-8_3.9x4.9mm_P1.27mm
pins: 1 BST, 2 VD, 3 SGND (power), 4 FB (in), 5 ON/~{{OFF}} (in), 6 GND (power), 7 VIN (power), 8 LX (out)

## MAX5035EUSA
designator *  value MAX5035EUSA
ki_keywords: Adjustable 1A Step-Down Converter 76V; ki_description: 1A, High-Efficiency Step-Down DC-DC Converter, adjustable output voltage, Vin 76V, SO-8; ki_fp_filters: SOIC*3.9x4.9mm*P1.27mm*; Footprint: Package_SO:SOIC-8_3.9x4.9mm_P1.27mm; Supplier: http://datasheets.maximintegrated.com/en/ds/MAX5035.pdf
footprint SOIC-8_3.9x4.9mm_P1.27mm
pins: 1 BST, 2 VD, 3 SGND (power), 4 FB (in), 5 ON/~{{OFF}} (in), 6 GND (power), 7 VIN (power), 8 LX (out)

## MAX15062A
designator *  value MAX15062A
ki_keywords: step-down dc-dc switching regulator; ki_description: 60V, 300mA, synchronous step-down dc-dc converter, 3.3V fixed output voltage, DFN-8; ki_fp_filters: DFN*2x2mm*P0.5mm*; Footprint: Package_DFN_QFN:DFN-8_2x2mm_P0.5mm; Supplier: http://datasheets.maximintegrated.com/en/ds/MAX15062.pdf
footprint DFN-8_2x2mm_P0.5mm
pins: 1 VIN (power), 2 EN/UVLO (in), 3 VCC (power), 4 FB/Vout (in), 5 MODE (in), 6 ~{{RESET}} (oc), 7 GND (power), 8 LX (power)

## MAX15062B
designator *  value MAX15062B
ki_keywords: step-down dc-dc switching regulator; ki_description: 60V, 300mA, synchronous step-down dc-dc converter, 5.0V fixed output voltage, DFN-8; ki_fp_filters: DFN*2x2mm*P0.5mm*; Footprint: Package_DFN_QFN:DFN-8_2x2mm_P0.5mm; Supplier: http://datasheets.maximintegrated.com/en/ds/MAX15062.pdf
footprint DFN-8_2x2mm_P0.5mm
pins: 1 VIN (power), 2 EN/UVLO (in), 3 VCC (power), 4 FB/Vout (in), 5 MODE (in), 6 ~{{RESET}} (oc), 7 GND (power), 8 LX (power)

## MAX15062C
designator *  value MAX15062C
ki_keywords: step-down dc-dc switching regulator; ki_description: 60V, 300mA, synchronous step-down dc-dc converter, adjustable output voltage, DFN-8; ki_fp_filters: DFN*2x2mm*P0.5mm*; Footprint: Package_DFN_QFN:DFN-8_2x2mm_P0.5mm; Supplier: http://datasheets.maximintegrated.com/en/ds/MAX15062.pdf
footprint DFN-8_2x2mm_P0.5mm
pins: 1 VIN (power), 2 EN/UVLO (in), 3 VCC (power), 4 FB/Vout (in), 5 MODE (in), 6 ~{{RESET}} (oc), 7 GND (power), 8 LX (power)

## MAX17501AxTB
designator *  value MAX17501AxTB
ki_keywords: Step-down dc-dc switching regulator; ki_description: 4.5V–60Vin, 500mA, High-Efficiency, 3.3V Synchronous Step-Down DC-DC Converter, PFM Mode, TDFN-10; ki_fp_filters: TDFN*1EP*2x3mm*P0.5mm*; Footprint: Package_DFN_QFN:TDFN-10-1EP_2x3mm_P0.5mm_EP0.9x2mm; Supplier: https://datasheets.maximintegrated.com/en/ds/MAX17501.pdf
footprint TDFN-10-1EP_2x3mm_P0.5mm_EP0.9x2mm
pins: 1 PGND (power), 2 VIN (power), 3 EN/UVLO (in), 4 VCC (power), 5 FB/VO (in), 6 SS, 7 NC (in) hidden, 8 ~{{RESET}} (oc), 9 GND (power), 10 LX (power), 11 GND hidden

## MAX17501BxTB
designator *  value MAX17501BxTB
ki_keywords: Step-down dc-dc switching regulator; ki_description: 4.5V–60Vin, 500mA, High-Efficiency, 5V Synchronous Step-Down DC-DC Converter, PFM Mode, DFN-10; ki_fp_filters: TDFN*1EP*2x3mm*P0.5mm*; Footprint: Package_DFN_QFN:TDFN-10-1EP_2x3mm_P0.5mm_EP0.9x2mm; Supplier: https://datasheets.maximintegrated.com/en/ds/MAX17501.pdf
footprint TDFN-10-1EP_2x3mm_P0.5mm_EP0.9x2mm
pins: 1 PGND (power), 2 VIN (power), 3 EN/UVLO (in), 4 VCC (power), 5 FB/VO (in), 6 SS, 7 NC (in) hidden, 8 ~{{RESET}} (oc), 9 GND (power), 10 LX (power), 11 GND hidden